# Altium footprint library EMDC_Packages.PcbLib: 274 footprints (part 6 of 18)
Each footprint in its own frame and in the unit in brackets; x right, y up, seen from the top. Pads: shape width x height; smd on the part's side, far side on the other; paste and mask are expansions set on the pad; w line width, h text height; cw(c..) or ccw(c..) is an arc to the next point about the centre after c.
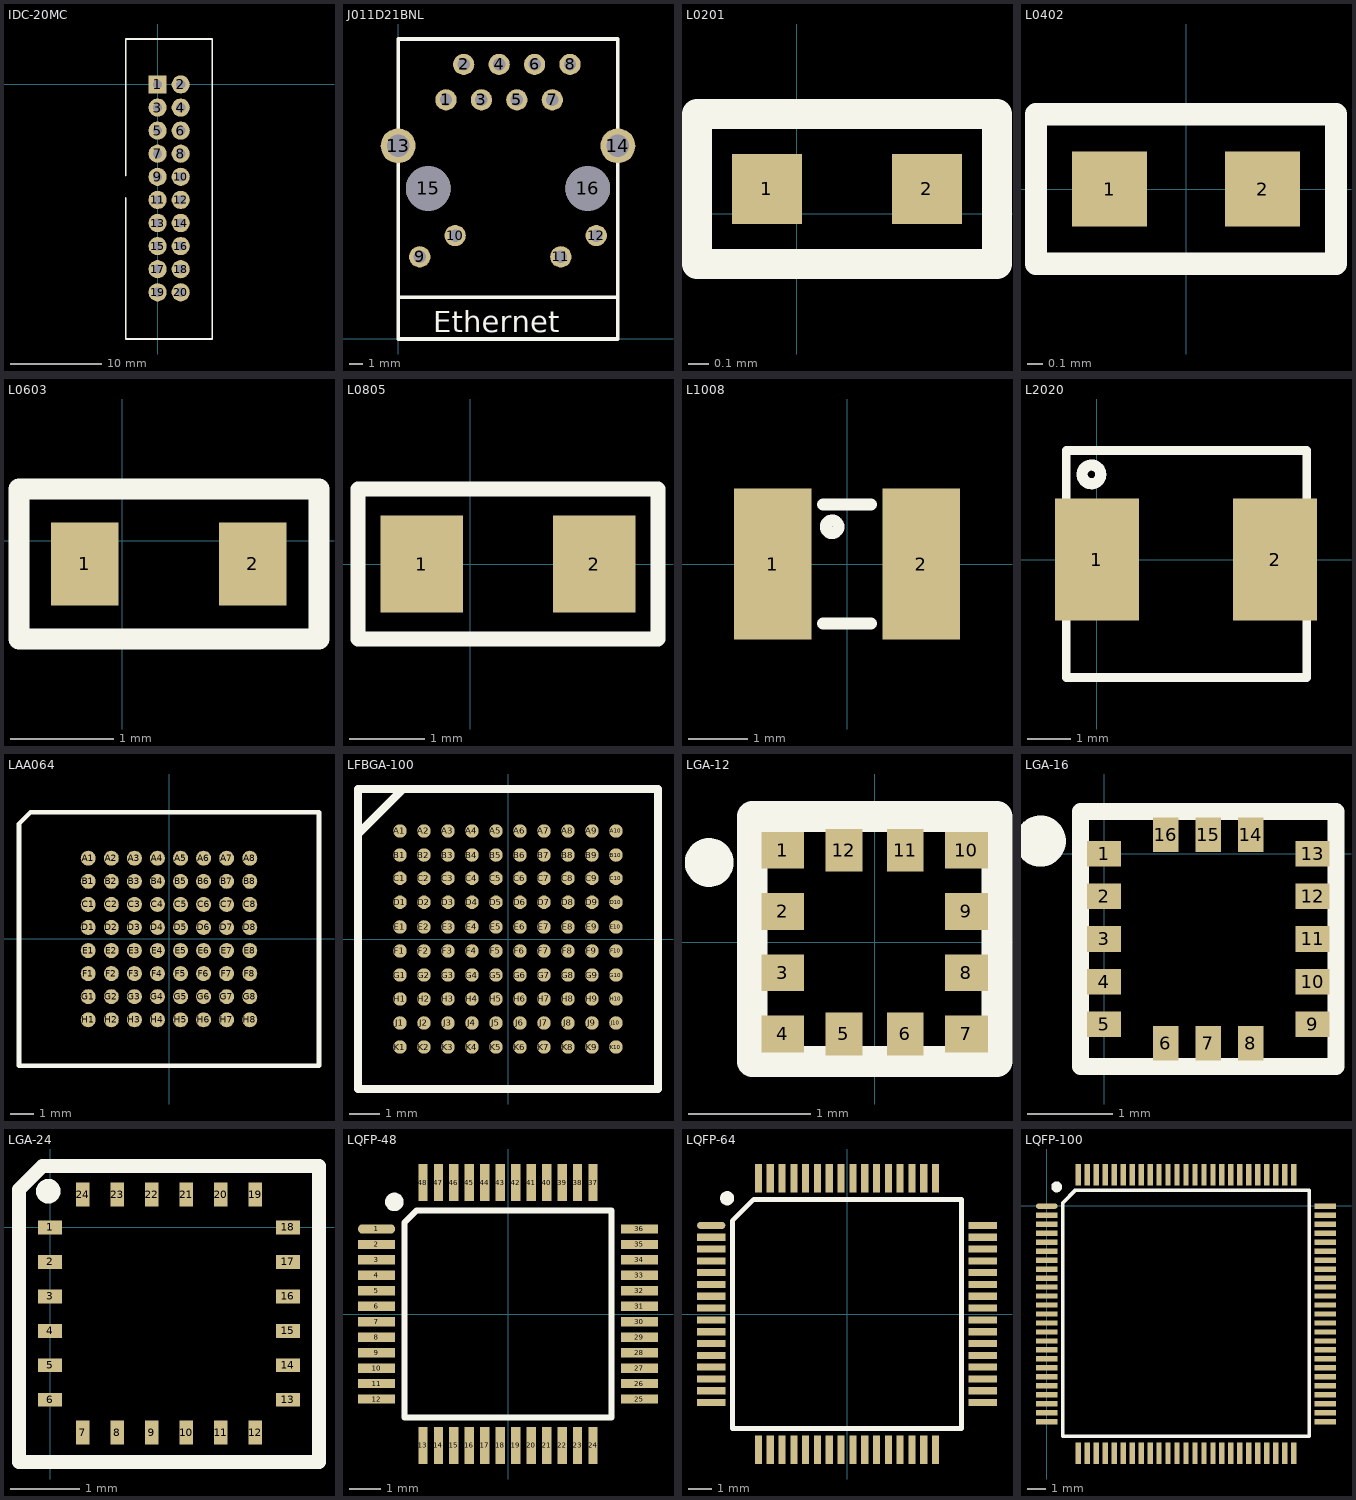
[diagram p5: the footprints below, top view; thin cyan lines are the x and y axes]

## IDC-20MC [mm] "IDC-20 Male Connector"
height 9
pads (20):
  rect 2x2 hole 1: 1(0,0)
  round 2 hole 1: 2(2.54,0) 3(0,-2.54) 4(2.54,-2.54) 5(0,-5.08) 6(2.54,-5.08) 7(0,-7.62) 8(2.54,-7.62) 9(0,-10.16) 10(2.54,-10.16) 11(0,-12.7) 12(2.54,-12.7) 13(0,-15.24) 14(2.54,-15.24) 15(0,-17.78) 16(2.54,-17.78) 17(0,-20.32) 18(2.54,-20.32) 19(0,-22.86) 20(2.54,-22.86)
Top Overlay:
  lines w0.2: -3.5,-12.5 -3.5,-28 6,-28 6,5 -3.5,5 -3.5,-10
3D body "User Library-BH-10__64BH-20.STEP": height 9.1, standoff -3, extent -3.28,-28.03 6.02,5.17

## J011D21BNL [mm] "RJ45 Jack with Transformers and Lights"
height 14
pads (16):
  round 1.524 hole 0.89: 1(3.43,17.14) 2(4.7,19.68) 3(5.97,17.14) 4(7.24,19.68) 5(8.51,17.14) 6(9.78,19.68) 7(11.05,17.14) 8(12.32,19.68) 9(1.55,5.89) 10(4.09,7.41) 11(11.66,5.89) 12(14.2,7.41)
  round 2.5 hole 1.6: 13(0,13.84) 14(15.75,13.84)
  round 3.2 hole 3.2 unplated: 15(2.16,10.79) 16(13.59,10.79)
Top Overlay:
  lines w0.254: 0,0.5 0,0 ; 0,3 15.75,3 ; 0,0 15.75,0 15.75,21.5 0,21.5 0,0
  text "Ethernet" at 2.5,0.5 h1.52
3D body "Ethernet jack.STEP": height 13.57, standoff -3.94, extent -0.429,-0.125 16.171,21.222

## L0201 [mm] "SMD Body 0.6 x 0.3 mm (LxW typ)"
height 0.35
pads (2):
  rect 0.35x0.35 smd: 1(-0.15,0.125) 2(0.65,0.125)
Top Overlay:
  lines w0.15: -0.5,-0.25 -0.5,0.5 1,0.5 1,-0.25 -0.5,-0.25
3D body "User Library-res0201-1.STEP": height 0.23, standoff 0, extent -0.05,-0.025 0.55,0.275

## L0402 [mm]
pads (2):
  rect 0.5x0.5 smd: 1(-0.51,0) 2(0.51,0)
Top Overlay:
  lines w0.15: -1,-0.5 1,-0.5 1,0.5 -1,0.5 -1,-0.5
3D body "User Library-res0402-1.STEP": height 0.3, standoff 0, extent -0.5,-0.25 0.5,0.25

## L0603 [mm]
pads (2):
  rect 0.65x0.8 smd: 1(-0.365,-0.225) 2(1.26,-0.225)
Top Overlay:
  lines w0.2: -1,-0.95 -1,0.5 1.9,0.5 1.9,-0.95 -1,-0.95
3D body "User Library-Chip Resistor_0603 (1608).STEP": height 0.47, standoff 0, extent -0.325,-0.625 1.275,0.177

## L0805 [mm]
pads (2):
  rect 1.1x1.3 smd: 1(-0.65,0) 2(1.65,0)
Top Overlay:
  lines w0.2: -1.5,-1 2.5,-1 2.5,1 -1.5,1 -1.5,-1
3D body "User Library-CRS0805.STEP": height 0.5, standoff 0, extent -0.5,-0.625 1.5,0.625

## L1008 [mm] "Inductor 1008 package"
pads (2):
  rect 1.3x2.54 smd: 1(-1.25,0) 2(1.25,0)
Top Overlay:
  circle w0.2: c-0.25,0.625 r0.106
  lines w0.2: -0.4,-1 0.4,-1 ; -0.4,1 0.4,1
3D body: height 0.9, standoff 0, extent -1.249,-0.999 1.249,0.999

## L2020 [mm]
pads (2):
  rect 1.915x2.79 smd: 1(0,0) 2(4.075,0)
Top Overlay:
  circle w0.254: c-0.125,1.95 r0.214
  lines w0.2: -0.7,-2.7 4.8,-2.7 4.8,2.5 -0.7,2.5 -0.7,-2.7
3D body "SMD_2020.stp": height 2, standoff 0.08, extent -0.701,-2.661 4.75,2.485

## LAA064 [mm]
pads (64):
  round 0.65 smd: A1(-3.5,3.5) A2(-2.5,3.5) A3(-1.5,3.5) A4(-0.5,3.5) A5(0.5,3.5) A6(1.5,3.5) A7(2.5,3.5) A8(3.5,3.5) B1(-3.5,2.5) B2(-2.5,2.5) B3(-1.5,2.5) B4(-0.5,2.5) B5(0.5,2.5) B6(1.5,2.5) B7(2.5,2.5) B8(3.5,2.5) C1(-3.5,1.5) C2(-2.5,1.5) C3(-1.5,1.5) C4(-0.5,1.5) C5(0.5,1.5) C6(1.5,1.5) C7(2.5,1.5) C8(3.5,1.5) D1(-3.5,0.5) D2(-2.5,0.5) D3(-1.5,0.5) D4(-0.5,0.5) D5(0.5,0.5) D6(1.5,0.5) D7(2.5,0.5) D8(3.5,0.5) E1(-3.5,-0.5) E2(-2.5,-0.5) E3(-1.5,-0.5) E4(-0.5,-0.5) E5(0.5,-0.5) E6(1.5,-0.5) E7(2.5,-0.5) E8(3.5,-0.5) F1(-3.5,-1.5) F2(-2.5,-1.5) F3(-1.5,-1.5) F4(-0.5,-1.5) F5(0.5,-1.5) F6(1.5,-1.5) F7(2.5,-1.5) F8(3.5,-1.5) G1(-3.5,-2.5) G2(-2.5,-2.5) G3(-1.5,-2.5) G4(-0.5,-2.5) G5(0.5,-2.5) G6(1.5,-2.5) G7(2.5,-2.5) G8(3.5,-2.5) H1(-3.5,-3.5) H2(-2.5,-3.5) H3(-1.5,-3.5) H4(-0.5,-3.5) H5(0.5,-3.5) H6(1.5,-3.5) H7(2.5,-3.5) H8(3.5,-3.5)
Top Overlay:
  lines w0.2: -6.5,-5.5 6.5,-5.5 6.5,5.5 -6,5.5 -6.5,5 -6.5,-5.5

## LFBGA-100 [mm] "10x10mm 0.8mm"
pads (100):
  round 0.45 smd: A1(-3.6,3.6) A2(-2.8,3.6) A3(-2,3.6) A4(-1.2,3.6) A5(-0.4,3.6) A6(0.4,3.6) A7(1.2,3.6) A8(2,3.6) A9(2.8,3.6) A10(3.6,3.6) B1(-3.6,2.8) B2(-2.8,2.8) B3(-2,2.8) B4(-1.2,2.8) B5(-0.4,2.8) B6(0.4,2.8) B7(1.2,2.8) B8(2,2.8) B9(2.8,2.8) B10(3.6,2.8) C1(-3.6,2.025) C2(-2.8,2.025) C3(-2,2.025) C4(-1.2,2.025) C5(-0.4,2.025) C6(0.4,2.025) C7(1.2,2.025) C8(2,2.025) C9(2.8,2.025) C10(3.6,2.025) D1(-3.6,1.225) D2(-2.8,1.225) D3(-2,1.225) D4(-1.2,1.225) D5(-0.4,1.225) D6(0.4,1.225) D7(1.2,1.225) D8(2,1.225) D9(2.8,1.225) D10(3.6,1.225) E1(-3.6,0.4) E2(-2.8,0.4) E3(-2,0.4) E4(-1.2,0.4) E5(-0.4,0.4) E6(0.4,0.4) E7(1.2,0.4) E8(2,0.4) E9(2.8,0.4) E10(3.6,0.4) F1(-3.6,-0.4) F2(-2.8,-0.4) F3(-2,-0.4) F4(-1.2,-0.4) F5(-0.4,-0.4) F6(0.4,-0.4) F7(1.2,-0.4) F8(2,-0.4) F9(2.8,-0.4) F10(3.6,-0.4) G1(-3.6,-1.2) G2(-2.8,-1.2) G3(-2,-1.2) G4(-1.2,-1.2) G5(-0.4,-1.2) G6(0.4,-1.2) G7(1.2,-1.2) G8(2,-1.2) G9(2.8,-1.2) G10(3.6,-1.2) H1(-3.6,-2) H2(-2.8,-2) H3(-2,-2) H4(-1.2,-2) H5(-0.4,-2) H6(0.4,-2) H7(1.2,-2) H8(2,-2) H9(2.8,-2) H10(3.6,-2) J1(-3.6,-2.8) J2(-2.8,-2.8) J3(-2,-2.8) J4(-1.2,-2.8) J5(-0.4,-2.8) J6(0.4,-2.8) J7(1.2,-2.8) J8(2,-2.8) J9(2.8,-2.8) J10(3.6,-2.8) K1(-3.6,-3.6) K2(-2.8,-3.6) K3(-2,-3.6) K4(-1.2,-3.6) K5(-0.4,-3.6) K6(0.4,-3.6) K7(1.2,-3.6) K8(2,-3.6) K9(2.8,-3.6) K10(3.6,-3.6)
Top Overlay:
  lines w0.254: -5,3.5 -3.5,5 ; -5,-5 -5,5 5,5 5,-5 -5,-5

## LGA-12 [mm]
pads (12):
  rect 0.35x0.3 smd: 1(-0.75,0.75) 2(-0.75,0.25) 3(-0.75,-0.25) 4(-0.75,-0.75) 7(0.75,-0.75) 8(0.75,-0.25) 9(0.75,0.25) 10(0.75,0.75)
  rect 0.3x0.35 smd: 5(-0.25,-0.75) 6(0.25,-0.75) 11(0.25,0.75) 12(-0.25,0.75)
Top Overlay:
  circle w0.2: c-1.35,0.65 r0.1
  lines w0.25: -1,-0.975 -1,1.025 1,1.025 1,-0.975 -1,-0.975
3D body "User Library-LGA-14 2x2x1.STEP": height 1, standoff 0, extent -1.1,-1.05 1.05,1.1

## LGA-16 [mm]
pads (16):
  rect 0.4x0.3 smd: 1(0,0) 2(0,-0.5) 3(0,-1) 4(0,-1.5) 5(0,-2) 9(2.45,-2) 10(2.45,-1.5) 11(2.45,-1) 12(2.45,-0.5) 13(2.45,0)
  rect 0.3x0.4 smd: 6(0.725,-2.225) 7(1.225,-2.225) 8(1.725,-2.225) 14(1.725,0.225) 15(1.225,0.225) 16(0.725,0.225)
Top Overlay:
  circle w0.5: c-0.75,0.15 r0.05
  lines w0.2: -0.275,-2.5 -0.275,0.5 2.725,0.5 2.725,-2.5 -0.275,-2.5
3D body "User Library-LIS331AL.STEP": height 1.01, standoff -0.01, extent -0.275,-2.5 2.725,0.5

## LGA-24 [mm]
pads (24):
  rect 0.35x0.2 smd: 1(0,0) 2(0,-0.5) 3(0,-1) 4(0,-1.5) 5(0,-2) 6(0,-2.5) 13(3.45,-2.5) 14(3.45,-2) 15(3.45,-1.5) 16(3.45,-1) 17(3.45,-0.5) 18(3.45,0)
  rect 0.2x0.35 smd: 7(0.475,-2.975) 8(0.975,-2.975) 9(1.475,-2.975) 10(1.975,-2.975) 11(2.475,-2.975) 12(2.975,-2.975) 19(2.975,0.475) 20(2.475,0.475) 21(1.975,0.475) 22(1.475,0.475) 23(0.975,0.475) 24(0.475,0.475)
Top Overlay:
  circle w0.254: c-0.025,0.525 r0.05
  lines w0.2: -0.45,-3.4 -0.45,0.55 -0.111,0.889 3.9,0.889 3.9,-3.4 -0.45,-3.4
3D body "User Library-LGA-24.STEP": height 1.08, standoff 0, extent -0.25,-3.25 3.75,0.75

## LQFP-48 [mm]
pads (48):
  oval 1.2x0.3 smd: 1(-4.25,2.75)
  rect 1.2x0.3 smd: 2(-4.25,2.25) 3(-4.25,1.75) 4(-4.25,1.25) 5(-4.25,0.75) 6(-4.25,0.25) 7(-4.25,-0.25) 8(-4.25,-0.75) 9(-4.25,-1.25) 10(-4.25,-1.75) 11(-4.25,-2.25) 12(-4.25,-2.75) 25(4.25,-2.75) 26(4.25,-2.25) 27(4.25,-1.75) 28(4.25,-1.25) 29(4.25,-0.75) 30(4.25,-0.25) 31(4.25,0.25) 32(4.25,0.75) 33(4.25,1.25) 34(4.25,1.75) 35(4.25,2.25) 36(4.25,2.75)
  rect 0.3x1.2 smd: 13(-2.75,-4.25) 14(-2.25,-4.25) 15(-1.75,-4.25) 16(-1.25,-4.25) 17(-0.75,-4.25) 18(-0.25,-4.25) 19(0.25,-4.25) 20(0.75,-4.25) 21(1.25,-4.25) 22(1.75,-4.25) 23(2.25,-4.25) 24(2.75,-4.25) 37(2.75,4.25) 38(2.25,4.25) 39(1.75,4.25) 40(1.25,4.25) 41(0.75,4.25) 42(0.25,4.25) 43(-0.25,4.25) 44(-0.75,4.25) 45(-1.25,4.25) 46(-1.75,4.25) 47(-2.25,4.25) 48(-2.75,4.25)
Top Overlay:
  circle w0.3: c-3.675,3.625 r0.15
  lines w0.2: -3.35,-3.35 -3.35,2.95 -2.95,3.35 3.35,3.35 3.35,-3.35 -3.35,-3.35
3D body "User Library-LQFP-48 LXE.STEP": height 1.6, standoff 0, extent -4.513,-4.513 4.513,4.513

## LQFP-64 [mm]
pads (64):
  oval 1.2x0.3 smd: 1(-5.75,3.75)
  rect 1.2x0.3 smd: 2(-5.75,3.25) 3(-5.75,2.75) 4(-5.75,2.25) 5(-5.75,1.75) 6(-5.75,1.25) 7(-5.75,0.75) 8(-5.75,0.25) 9(-5.75,-0.25) 10(-5.75,-0.75) 11(-5.75,-1.25) 12(-5.75,-1.75) 13(-5.75,-2.25) 14(-5.75,-2.75) 15(-5.75,-3.25) 16(-5.75,-3.75) 33(5.75,-3.75) 34(5.75,-3.25) 35(5.75,-2.75) 36(5.75,-2.25) 37(5.75,-1.75) 38(5.75,-1.25) 39(5.75,-0.75) 40(5.75,-0.25) 41(5.75,0.25) 42(5.75,0.75) 43(5.75,1.25) 44(5.75,1.75) 45(5.75,2.25) 46(5.75,2.75) 47(5.75,3.25) 48(5.75,3.75)
  rect 0.3x1.2 smd: 17(-3.75,-5.75) 18(-3.25,-5.75) 19(-2.75,-5.75) 20(-2.25,-5.75) 21(-1.75,-5.75) 22(-1.25,-5.75) 23(-0.75,-5.75) 24(-0.25,-5.75) 25(0.25,-5.75) 26(0.75,-5.75) 27(1.25,-5.75) 28(1.75,-5.75) 29(2.25,-5.75) 30(2.75,-5.75) 31(3.25,-5.75) 32(3.75,-5.75) 49(3.75,5.75) 50(3.25,5.75) 51(2.75,5.75) 52(2.25,5.75) 53(1.75,5.75) 54(1.25,5.75) 55(0.75,5.75) 56(0.25,5.75) 57(-0.25,5.75) 58(-0.75,5.75) 59(-1.25,5.75) 60(-1.75,5.75) 61(-2.25,5.75) 62(-2.75,5.75) 63(-3.25,5.75) 64(-3.75,5.75)
Top Overlay:
  circle w0.3: c-5.075,4.9 r0.15
  lines w0.2: -4.85,-4.85 -4.85,-4.85 ; -4.85,-4.85 -4.85,-4.85 ; -4.85,-4.85 4.85,-4.85 4.85,4.85 -3.95,4.85 -4.85,3.95 -4.85,-4.85
3D body "User Library-lqpf64.STEP": height 1.5, standoff 0.02, extent -6,-6 6,6

## LQFP-100 [mm]
pads (100):
  oval 1.2x0.3 smd: 1(0,-0.025)
  rect 1.2x0.3 smd: 2(0,-0.525) 3(0,-1.025) 4(0,-1.525) 5(0,-2.025) 6(0,-2.525) 7(0,-3.025) 8(0,-3.525) 9(0,-4.025) 10(0,-4.525) 11(0,-5.025) 12(0,-5.525) 13(0,-6.025) 14(0,-6.525) 15(0,-7.025) 16(0,-7.525) 17(0,-8.025) 18(0,-8.525) 19(0,-9.025) 20(0,-9.525) 21(0,-10.025) 22(0,-10.525) 23(0,-11.025) 24(0,-11.525) 25(0,-12.025) 51(15.5,-12.025) 52(15.5,-11.525) 53(15.5,-11.025) 54(15.5,-10.525) 55(15.5,-10.025) 56(15.5,-9.525) 57(15.5,-9.025) 58(15.5,-8.525) 59(15.5,-8.025) 60(15.5,-7.525) 61(15.5,-7.025) 62(15.5,-6.525) 63(15.5,-6.025) 64(15.5,-5.525) 65(15.5,-5.025) 66(15.5,-4.525) 67(15.5,-4.025) 68(15.5,-3.525) 69(15.5,-3.025) 70(15.5,-2.525) 71(15.5,-2.025) 72(15.5,-1.525) 73(15.5,-1.025) 74(15.5,-0.525) 75(15.5,-0.025)
  rect 0.3x1.2 smd: 26(1.75,-13.775) 27(2.25,-13.775) 28(2.75,-13.775) 29(3.25,-13.775) 30(3.75,-13.775) 31(4.25,-13.775) 32(4.75,-13.775) 33(5.25,-13.775) 34(5.75,-13.775) 35(6.25,-13.775) 36(6.75,-13.775) 37(7.25,-13.775) 38(7.75,-13.775) 39(8.25,-13.775) 40(8.75,-13.775) 41(9.25,-13.775) 42(9.75,-13.775) 43(10.25,-13.775) 44(10.75,-13.775) 45(11.25,-13.775) 46(11.75,-13.775) 47(12.25,-13.775) 48(12.75,-13.775) 49(13.25,-13.775) 50(13.75,-13.775) 76(13.75,1.725) 77(13.25,1.725) 78(12.75,1.725) 79(12.25,1.725) 80(11.75,1.725) 81(11.25,1.725) 82(10.75,1.725) 83(10.25,1.725) 84(9.75,1.725) 85(9.25,1.725) 86(8.75,1.725) 87(8.25,1.725) 88(7.75,1.725) 89(7.25,1.725) 90(6.75,1.725) 91(6.25,1.725) 92(5.75,1.725) 93(5.25,1.725) 94(4.75,1.725) 95(4.25,1.725) 96(3.75,1.725) 97(3.25,1.725) 98(2.75,1.725) 99(2.25,1.725) 100(1.75,1.725)
Top Overlay:
  circle w0.3: c0.55,1.05 r0.15
  lines w0.2: 0.9,-12.825 0.9,0.175 1.6,0.875 14.6,0.875 14.6,-12.825 0.9,-12.825
3D body "LQFP-100.step": height 1.5, standoff 0.02, extent -0.25,-13.994 15.75,2.006